# Altium footprint library biblioteka_pcb.PcbLib: 184 footprints (part 6 of 12)
Each footprint in its own frame and in the unit in brackets; x right, y up, seen from the top. Pads: shape width x height; smd on the part's side, far side on the other; paste and mask are expansions set on the pad; w line width, h text height; cw(c..) or ccw(c..) is an arc to the next point about the centre after c.
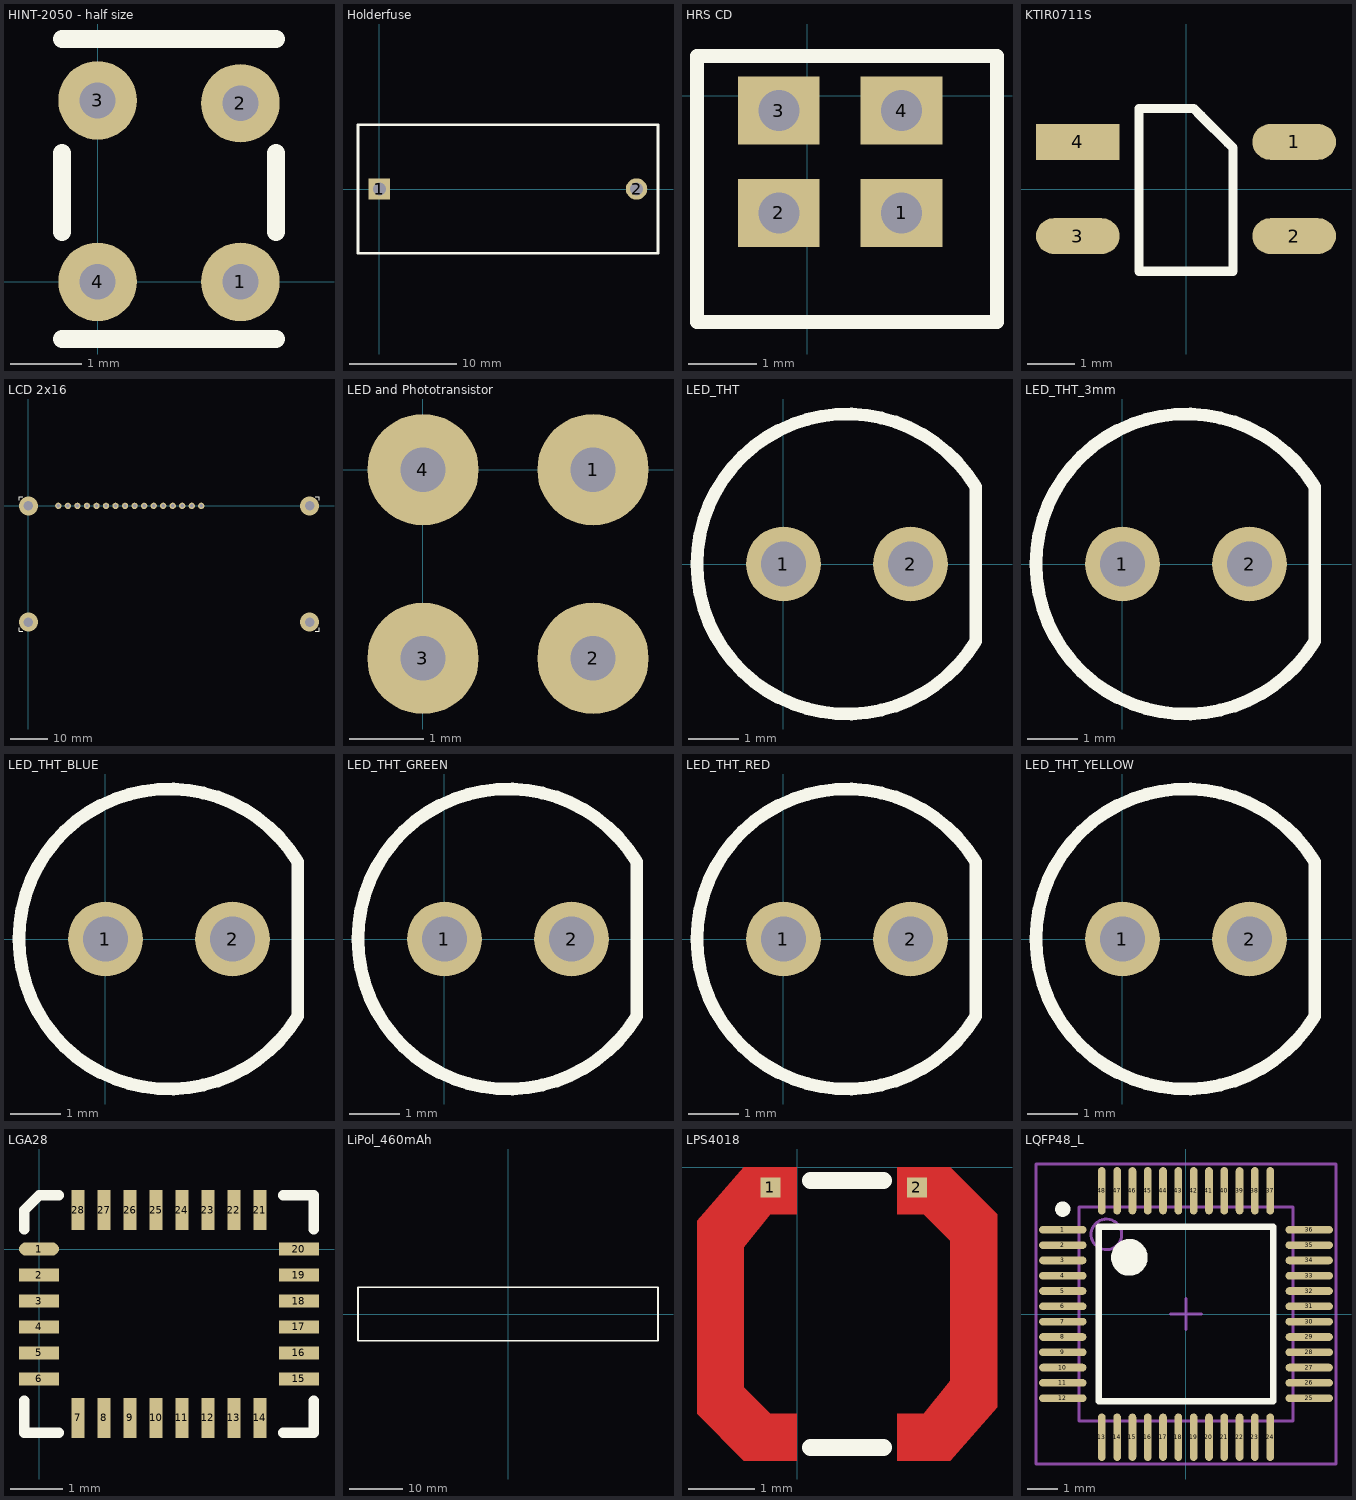
[diagram p5: the footprints below, top view; thin cyan lines are the x and y axes]

## HINT-2050 - half size [mm]
pads (4):
  round 1.1 hole 0.5: 1(2,0) 2(2,2.5) 3(0,2.54) 4(0,0)
Top Overlay:
  lines w0.254: -0.5,-0.8 2.5,-0.8 ; -0.5,0.7 -0.5,1.8 ; -0.5,3.4 2.5,3.4 ; 2.5,0.7 2.5,1.8

## Holderfuse [mm] "8x20mm fuse holder"
pads (2):
  rect 2x2 hole 1.2: 1(0,0)
  round 2 hole 1.2: 2(24,0)
Top Overlay:
  lines w0.254: -2,-6 -2,6 26,6 26,-6 -2,-6
3D body "Fuseholder.stp": height 10.5, standoff -1, extent -0.406,-4.975 24.394,5.025

## HRS CD [mm] "Sensor for encoder"
pads (4):
  rect 1.2x1 hole 0.6: 1(1.381,-1.719) 2(-0.419,-1.719) 3(-0.419,-0.219) 4(1.381,-0.219)
Top Overlay:
  lines w0.2: -1.619,-3.319 -1.619,0.581 2.781,0.581 2.781,-3.319 -1.619,-3.319
3D body "HRS-CD.stp": height 6.7, standoff -1.5, extent -1.219,-2.819 2.281,-0.119

## KTIR0711S [mm]
pads (4):
  oval 1.778x0.762 smd: 1(2.3,1) 2(2.3,-1) 3(-2.3,-1)
  rect 1.778x0.762 smd: 4(-2.3,1)
Top Overlay:
  lines w0.2: -1,-1.75 1,-1.75 1,0.875 0.889,0.986 0.32,1.555 0.163,1.712 -1,1.712 -1,-1.75
3D body "ktir0711s.stp": height 1.5, standoff 0, extent -2.3,-1.75 2.2,1.65

## LCD 2x16 [mm]
pads (16):
  round 1.7 hole 0.9: 1(8,0) 2(10.54,0) 3(13.08,0) 4(15.62,0) 5(18.16,0) 6(20.7,0) 7(23.24,0) 8(25.78,0) 9(28.32,0) 10(30.86,0) 11(33.4,0) 12(35.94,0) 13(38.48,0) 14(41.02,0) 15(43.56,0) 16(46.1,0)
via 0,0 diameter 5 hole 2.5
via 0,-31 diameter 5 hole 2.5
via 75,0 diameter 5 hole 2.5
via 75,-31 diameter 5 hole 2.5
Top Overlay:
  lines w0.254: -2.5,-32.5 -2.5,-33.5 -1.5,-33.5 ; -2.5,1.5 -2.5,2.5 -1.5,2.5 ; 76.5,-33.5 77.5,-33.5 77.5,-32.5 ; 76.5,2.5 77.5,2.5 77.5,1.5

## LED and Phototransistor [mm]
pads (4):
  round 1.5 hole 0.6: 1(2.29,0) 2(2.29,-2.54) 3(0,-2.54) 4(0,0)
3D body "LED_Team_Max.stp": height 14.94, standoff -1, extent -11.666,-4.226 2.522,1.651

## LED_THT [mm] "Bended version of LED\Phototransistor"
pads (2):
  round 1.5 hole 0.9: 1(0,0) 2(2.54,0)
Top Overlay:
  lines w0.254: 3.842,1.505 3.842,-1.543 cw(c1.27,0) 3.842,1.543
3D body "LED_THT_transparent.stp": height 8.97, standoff -3, extent -1.63,-2.874 3.77,2.926

## LED_THT_3mm [mm]
pads (2):
  round 1.5 hole 0.9: 1(0,0) 2(2.54,0)
Top Overlay:
  lines w0.254: 3.842,-1.543 cw(c1.27,0) 3.842,1.543 3.842,-1.543
3D body "LED3mm.stp": height 5.46, standoff -1, extent -0.254,-1.499 2.885,1.499

## LED_THT_BLUE [mm]
pads (2):
  round 1.5 hole 0.9: 1(0,0) 2(2.54,0)
Top Overlay:
  lines w0.254: 3.842,1.505 3.842,-1.543 cw(c1.27,0) 3.842,1.543
3D body "LED_THT_BLUE.stp": height 8.97, standoff -3, extent -1.63,-2.874 3.77,2.926

## LED_THT_GREEN [mm]
pads (2):
  round 1.5 hole 0.9: 1(0,0) 2(2.54,0)
Top Overlay:
  lines w0.254: 3.842,1.505 3.842,-1.543 cw(c1.27,0) 3.842,1.543
3D body "LED_THT_GREEN.stp": height 8.97, standoff -3, extent -1.63,-2.874 3.77,2.926

## LED_THT_RED [mm]
pads (2):
  round 1.5 hole 0.9: 1(0,0) 2(2.54,0)
Top Overlay:
  lines w0.254: 3.842,1.505 3.842,-1.543 cw(c1.27,0) 3.842,1.543
3D body "LED_THT_RED.stp": height 8.97, standoff -3, extent -1.63,-2.874 3.77,2.926

## LED_THT_YELLOW [mm]
pads (2):
  round 1.5 hole 0.9: 1(0,0) 2(2.54,0)
Top Overlay:
  lines w0.254: 3.842,1.505 3.842,-1.543 cw(c1.27,0) 3.842,1.543
3D body "LED_THT_YELLOW.stp": height 8.97, standoff -3, extent -1.63,-2.874 3.77,2.926

## LGA28 [mm]
pads (28):
  oval 0.77x0.25 smd: 1(0,0)
  rect 0.77x0.25 smd: 2(0,-0.5) 3(0,-1) 4(0,-1.5) 5(0,-2) 6(0,-2.5) 15(5,-2.5) 16(5,-2) 17(5,-1.5) 18(5,-1) 19(5,-0.5) 20(5,0)
  rect 0.25x0.77 smd: 7(0.75,-3.25) 8(1.25,-3.25) 9(1.75,-3.25) 10(2.25,-3.25) 11(2.75,-3.25) 12(3.25,-3.25) 13(3.75,-3.25) 14(4.25,-3.25) 21(4.25,0.75) 22(3.75,0.75) 23(3.25,0.75) 24(2.75,0.75) 25(2.25,0.75) 26(1.75,0.75) 27(1.25,0.75) 28(0.75,0.75)
Top Overlay:
  lines w0.2: -0.285,-2.921 -0.285,-3.535 0.381,-3.535 ; -0.285,0.381 -0.285,0.75 0,1.035 0.381,1.035 ; 4.699,-3.535 5.285,-3.535 5.285,-2.921 ; 4.699,1.035 5.285,1.035 5.285,0.381
3D body: height 1.1, standoff 0, extent 0,-3.175 5,0.762

## LiPol_460mAh [mm]
Top Overlay:
  lines w0.3: 28,5 28,-5 -28,-5 -28,5 28,5 ; 28,5 28,5
3D body "LiPol_460.stp": height 30, standoff 0, extent -28,-5 28,5

## LPS4018 [mm]
pads (2):
  rect 0.3x0.3 smd: 1(-0.4,-0.3) 2(1.8,-0.3)
Top Layer:
  region: 1.5,-4.4 2.3,-4.4 3,-3.6 3,-0.7 2.3,0 1.5,0 1.5,-0.7 1.9,-0.7 2.3,-1.1 2.3,-3.2 1.9,-3.7 1.5,-3.7
  region: 0,0 -0.8,0 -1.5,-0.8 -1.5,-3.7 -0.8,-4.4 0,-4.4 0,-3.7 -0.4,-3.7 -0.8,-3.3 -0.8,-1.2 -0.4,-0.7 0,-0.7
Top Overlay:
  lines w0.254: 0.2,-4.2 1.3,-4.2 ; 0.2,-0.2 1.3,-0.2
Top Solder:
  region: 0,0 -0.8,0 -1.5,-0.8 -1.5,-3.7 -0.8,-4.4 0,-4.4 0,-3.7 -0.4,-3.7 -0.8,-3.3 -0.8,-1.2 -0.4,-0.7 0,-0.7
  region: 1.5,-4.4 2.3,-4.4 3,-3.6 3,-0.7 2.3,0 1.5,0 1.5,-0.7 1.9,-0.7 2.3,-1.1 2.3,-3.2 1.9,-3.7 1.5,-3.7

## LQFP48_L [mm] "Thin QFP, 48-Leads, Body 7x7mm, Pitch 0.5mm, IPC High Density"
height 1.6
pads (48):
  oval 1.55x0.25 smd: 1(-4.025,2.75) 2(-4.025,2.25) 3(-4.025,1.75) 4(-4.025,1.25) 5(-4.025,0.75) 6(-4.025,0.25) 7(-4.025,-0.25) 8(-4.025,-0.75) 9(-4.025,-1.25) 10(-4.025,-1.75) 11(-4.025,-2.25) 12(-4.025,-2.75) 25(4.025,-2.75) 26(4.025,-2.25) 27(4.025,-1.75) 28(4.025,-1.25) 29(4.025,-0.75) 30(4.025,-0.25) 31(4.025,0.25) 32(4.025,0.75) 33(4.025,1.25) 34(4.025,1.75) 35(4.025,2.25) 36(4.025,2.75)
  oval 0.25x1.55 smd: 13(-2.75,-4.025) 14(-2.25,-4.025) 15(-1.75,-4.025) 16(-1.25,-4.025) 17(-0.75,-4.025) 18(-0.25,-4.025) 19(0.25,-4.025) 20(0.75,-4.025) 21(1.25,-4.025) 22(1.75,-4.025) 23(2.25,-4.025) 24(2.75,-4.025) 37(2.75,4.025) 38(2.25,4.025) 39(1.75,4.025) 40(1.25,4.025) 41(0.75,4.025) 42(0.25,4.025) 43(-0.25,4.025) 44(-0.75,4.025) 45(-1.25,4.025) 46(-1.75,4.025) 47(-2.25,4.025) 48(-2.75,4.025)
Top Overlay:
  circle w0.25: c-4.025,3.425 r0.125
  circle w0.6: c-1.85,1.85 r0.3
  lines w0.2: -2.85,-2.85 -2.85,2.85 2.85,2.85 2.85,-2.85 -2.85,-2.85
Mechanical 13:
  circle w0.1: c-2.6,2.6 r0.5
  lines w0.1: -3.5,-3.5 -3.5,3.5 3.5,3.5 3.5,-3.5 -3.5,-3.5
Mechanical 15:
  lines w0.1: -0.5,0 0.5,0 ; 0,-0.5 0,0.5 ; -4.9,-4.9 -4.9,4.9 4.9,4.9 4.9,-4.9 -4.9,-4.9
3D body "LQFP48_L.stp": height 1.4, standoff 0, extent -4.5,-4.5 4.5,4.5